# Altium footprint library PcbLib_jp.PcbLib: 255 footprints (part 5 of 16)
Each footprint in its own frame and in the unit in brackets; x right, y up, seen from the top. Pads: shape width x height; smd on the part's side, far side on the other; paste and mask are expansions set on the pad; w line width, h text height; cw(c..) or ccw(c..) is an arc to the next point about the centre after c.
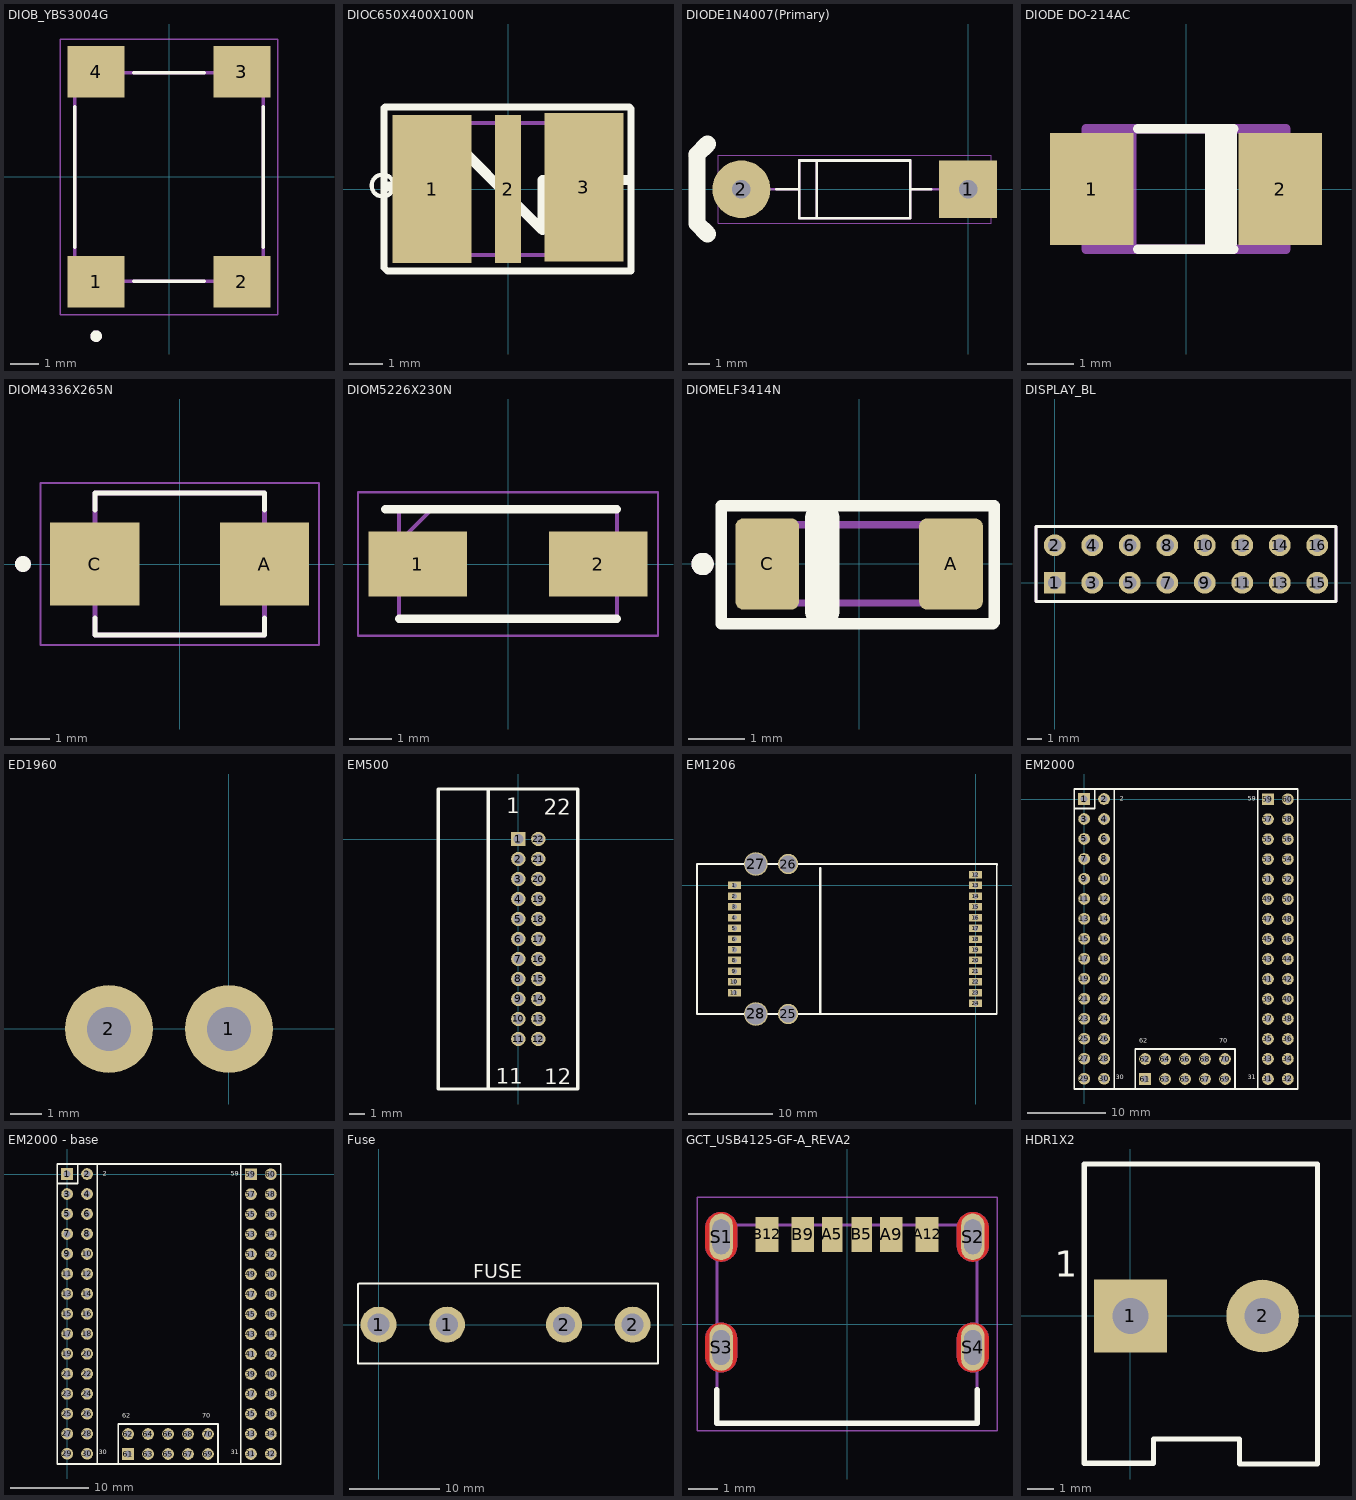
[diagram p4: the footprints below, top view; thin cyan lines are the x and y axes]

## DIOB_YBS3004G [mm]
pads (4):
  rect 2x1.8 smd: 1(-2.55,-3.675) 2(2.55,-3.675) 3(2.55,3.675) 4(-2.55,3.675)
Top Overlay:
  circle w0.2: c-2.55,-5.575 r0.1
  lines w0.127: -3.3,-2.455 -3.3,2.455 ; -1.23,-3.65 1.23,-3.65 ; -1.23,3.65 1.23,3.65 ; 3.3,-2.455 3.3,2.455
Mechanical 13:
  circle w0.2: c-2.55,-5.575 r0.1
  lines w0.127: -3.3,-3.65 3.3,-3.65 3.3,3.65 -3.3,3.65 -3.3,-3.65
Mechanical 15:
  lines w0.05: -3.8,-4.825 3.8,-4.825 3.8,4.825 -3.8,4.825 -3.8,-4.825
3D body "step_temp.STEP": height 1.5, standoff 0, extent -3.3,-4.125 3.3,4.125

## DIOC650X400X100N [mm]
pads (3):
  rect 2.4x4.5 smd paste-3 mask+0: 1(-2.3,0) 3(2.3,0.05)
  rect 0.8x4.5 smd paste-3 mask+0: 2(0,0)
Top Overlay:
  circle w0.127: c-3.803,0.105 r0.333
  lines w0.203: -3.759,-2.388 -3.759,2.464 -3.734,2.489 3.683,2.489 3.734,2.438 3.734,-2.489 -3.658,-2.489 -3.759,-2.388
  lines w0.305: -3.658,0.076 -2.362,0.076 -2.286,0.152 -2.286,2.083 1.041,-1.245 1.041,0.279 3.607,0.279
Top Paste:
  region: 2.925,-1.678 1.127,-1.678 1.127,1.675 2.925,1.675
  region: 0.375,-1.675 -0.375,-1.675 -0.375,1.675 0.375,1.675
  region: -1.125,-1.677 -2.929,-1.677 -2.929,1.675 -1.125,1.675
Top Solder:
  region: 0.4,-1.7 -0.4,-1.7 -0.4,1.7 0.4,1.7
  region: -1.1,-1.701 -2.952,-1.701 -2.952,1.7 -1.1,1.7
  region: 2.95,-1.701 1.101,-1.701 1.101,1.7 2.95,1.7
Mechanical 13:
  lines w0.127: -3.25,-2 3.25,-2 3.25,2 -3.25,2 -3.25,-2
Mechanical 15:
  lines w0.05: -3.75,-2.5 3.75,-2.5 3.75,2.5 -3.75,2.5 -3.75,-2.5
3D body "User Library-TBU_DF(2).STEP": height 2.01, standoff 0.95, extent -3.427,-2.896 3.173,2.704

## DIODE1N4007(Primary) [mm]
pads (2):
  rect 2.7x2.7 hole 0.86: 1(0,0)
  round 2.7 hole 0.86: 2(-10.6,0)
Top Layer:
  lines w0.8: -12.675,1.6 -12.675,1.626 -12.675,1.6
Top Overlay:
  lines w0.127: -8.958,0 -7.9,0 ; -1.719,0 -2.7,0 ; -7.9,0 -7.9,1.35 -7.075,1.35 ; -7.9,0 -7.9,-1.35 -7.075,-1.35 ; -7.075,-1.35 -2.7,-1.35 -2.7,0 ; -7.075,-1.35 -7.075,1.35 ; -7.075,1.35 -2.7,1.35 -2.7,0
  lines w0.8: -12.675,1.6 -12.675,-1.6 -12.192,-2.083 ; -12.675,1.626 -12.192,2.108
Mechanical 13:
  lines w0.127: -7.9,-1.35 -7.075,-1.35 ; -7.9,-1.35 -7.9,0 ; -7.9,-1.35 -7.075,-1.35 ; -7.9,-1.35 -7.9,0 ; -7.9,0 -7.9,1.35 ; -7.9,0 -9.2,0 -7.9,0 ; -7.9,0 -7.9,1.35 ; -7.9,1.35 -7.075,1.35 ; -7.9,1.35 -7.075,1.35 ; -7.075,-1.35 -7.075,1.35 ; -7.075,-1.35 -2.7,-1.35 ; -7.075,-1.35 -2.7,-1.35 ; -7.075,-1.35 -7.075,1.35 ; -7.075,1.35 -2.7,1.35 ; -7.075,1.35 -2.7,1.35 ; -2.7,-1.35 -2.7,0 ; -2.7,-1.35 -2.7,0 ; -2.7,0 -2.7,1.35 ; -2.7,0 -1.4,0 -2.7,0 ; -2.7,0 -2.7,1.35
Mechanical 16:
  lines w0.05: -11.675,-1.6 1.075,-1.6 1.075,1.6 -11.675,1.6 -11.675,-1.6
3D body: height 0.25, standoff 0, extent -0.601,3.302 -0.601,3.302
3D body "User Library-1N4007 x7mm.STEP": height 6.31, standoff 1.1, extent -9.073,-1.437 -1.273,1.183

## DIODE DO-214AC [mm]
pads (2):
  rect 1.8x2.4 smd: 1(-2.025,0) 2(2.025,0)
Top Overlay:
  region: 1.092,-1.2 0.417,-1.2 0.417,1.251 1.092,1.251
  lines w0.203: -1.035,-1.3 1.025,-1.3 ; -1.035,1.3 1.025,1.3
Mechanical 13:
  region: -1.075,-1.226 -1.751,-1.226 -1.751,1.225 -1.075,1.225
  region: 2.825,-1.102 2.178,-1.102 2.178,1.1 2.825,1.1
  region: -2.175,-1.1 -2.826,-1.1 -2.826,1.1 -2.175,1.1
  lines w0.203: -2.15,-1.3 -2.15,1.3 2.15,1.3 2.15,-1.3 -2.15,-1.3
3D body "User Library-DO-214AC SMA.STEP": height 2, standoff -0.4, extent -2.6,-1.326 2.6,1.274
3D body: height 0.25, standoff 0, extent 0.483,-0.025 0.483,-0.025
3D body: height 0.25, standoff 0, extent 0.813,0 0.813,0

## DIOM4336X265N [mm]
pads (2):
  rect 2.28x2.12 smd: A(2.165,0) C(-2.165,0)
Top Overlay:
  circle w0.2: c-4,0 r0.1
  lines w0.127: -2.163,-1.38 -2.163,-1.813 2.163,-1.813 2.163,-1.38 ; -2.163,1.38 -2.163,1.813 2.163,1.813 2.163,1.38
Mechanical 13:
  circle w0.2: c-4,0 r0.1
  lines w0.127: -2.163,-1.813 2.163,-1.813 2.163,1.813 -2.163,1.813 -2.163,-1.813
Mechanical 15:
  lines w0.05: -3.555,-2.063 3.555,-2.063 3.555,2.063 -3.555,2.063 -3.555,-2.063
3D body "SS23.STEP": height 2.65, standoff 0, extent -2.7,-1.842 2.64,1.783

## DIOM5226X230N [mm]
pads (2):
  rect 2.35x1.55 smd: 1(-2.15,0) 2(2.15,0)
Top Overlay:
  lines w0.2: -2.925,1.302 2.598,1.302 ; -2.598,-1.302 2.598,-1.302
Mechanical 13:
  lines w0.1: -2.598,0.528 -1.822,1.302 ; -2.598,-1.302 2.598,-1.302 2.598,1.302 -2.598,1.302 -2.598,-1.302
Mechanical 15:
  lines w0.05: -3.575,-1.71 3.575,-1.71 3.575,1.71 -3.575,1.71 -3.575,-1.71
3D body "B320A-13-F.stp": height 2.3, standoff 0, extent -2.598,-1.302 2.598,1.302

## DIOMELF3414N [mm]
pads (2):
  rrect25% 1.14x1.63 smd: A(1.64,0) C(-1.64,0)
Top Overlay:
  circle w0.2: c-2.795,0 r0.1
  lines w0.203: -2.464,-1.067 -2.464,1.041 2.413,1.041 2.413,-1.041 2.388,-1.067 -2.464,-1.067
  lines w0.61: -0.66,-0.838 -0.66,0.813
Mechanical 13:
  circle w0.2: c-2.795,0 r0.1
  lines w0.127: -1.7,-0.7 1.7,-0.7 1.7,0.7 -1.7,0.7 -1.7,-0.7
Mechanical 15:
  lines w0.05: -2.46,-1.065 2.46,-1.065 2.46,1.065 -2.46,1.065 -2.46,-1.065
3D body "FDLL4148.STEP": height 1.75, standoff 0.25, extent -1.725,-0.7 1.725,0.8

## DISPLAY_BL [mil]
pads (16):
  rect 58x58 / inner round 60 / far side rect 58x58 hole 37: 1(0,0)
  round 58 / inner round 60 / far side round 58 hole 37: 2(0,100) 3(100,0) 4(100,100) 5(200,0) 6(200,100) 7(300,0) 8(300,100) 9(400,0) 10(400,100) 11(500,0) 12(500,100) 13(600,0) 14(600,100) 15(700,0) 16(700,100)
Top Overlay:
  lines w8: -50,-50 750,-50 750,150 -50,150 -50,-50
Mechanical 1:
  lines w8: -50,-50 750,-50 750,150 -50,150 -50,-50
3D body "User Library-Header 2x8.STEP": height 372.44, standoff -125.59, extent -199.98,-125.19 900.01,237.02

## ED1960 [mil]
pads (2):
  round 110 / inner round 60 / far side round 110 hole 55 mask+10: 1(0,0) 2(-150,0)
Bottom Overlay:
  lines w7: -250,-75 100,-75 100,0 100,300 -250,300 -250,-75

## EM500 [mil]
pads (22):
  rect 36x35 / inner round 60 / far side rect 36x35 hole 25 mask+3: 1(0,0)
  oval 36x35 / inner round 60 / far side rect 36x35 hole 25 mask+3: 2(0,-50) 3(0,-100) 4(0,-150) 5(0,-200) 6(0,-250) 7(0,-300) 8(0,-350) 9(0,-400) 10(0,-450) 11(0,-500) 12(50,-500) 13(50,-450) 14(50,-400) 15(50,-350) 16(50,-300) 17(50,-250) 18(50,-200) 19(50,-150) 20(50,-100) 21(50,-50) 22(50,0)
Top Overlay:
  lines w8: -75,-625 -75,125 ; -200,-625 -200,-612.5 -200,125 148.42,125 148.42,-625 -200,-625
  text "22" at 64,61 h39.37
  text "1" at -30,64 h39.37
  text "11" at -57,-612 h39.37
  text "12" at 65,-613 h39.37
3D body "Tibbo Technology Inc-EM500.STEP": height 633.86, standoff -108.27, extent -161.97,-608.27 90,108.27
3D body: height 559.05, standoff 0, extent -200,125 -200,125

## EM1206 [mil]
pads (28):
  rect 60x35 hole 25: 1(-1125,0) 2(-1125,-50) 3(-1125,-100) 4(-1125,-150) 5(-1125,-200) 6(-1125,-250) 7(-1125,-300) 8(-1125,-350) 9(-1125,-400) 10(-1125,-450) 11(-1125,-500) 12(0,50) 13(0,0) 14(0,-50) 15(0,-100) 16(0,-150) 17(0,-200) 18(0,-250) 19(0,-300) 20(0,-350) 21(0,-400) 22(0,-450) 23(0,-500) 24(0,-550)
  round 94.47 hole 78.73: 25(-875,-600) 26(-875,100)
  round 110.23 hole 100: 27(-1025,100) 28(-1025,-600)
Top Overlay:
  lines w8: -1300,-600 75,-600 98.42,-600 98.42,86.53 100,100 -1300,100 -1300,-600
  lines w10: -725,-600 -725,80
  text ".Comment" at -920.47,-388.6 h56.25
  text ".Pattern" at -914.4,-216.33 h56.25
  text ".Designator" at -920.47,-303.63 h56.25
Mechanical 1:
  text ".Designator" at -906.53,-464.9 h56.25
3D body "Tibbo Technology Inc-EM1206+RJ203.STEP": height 869.68, standoff -23.84, extent -1307.58,-645.67 47.74,141.73

## EM2000 [mm] "TIBBO"
pads (70):
  rect 1.5x1.5 hole 0.9: 1(0,0) 59(23.368,-0.025) 61(7.753,-35.595)
  round 1.5 hole 0.9: 2(2.54,0) 3(0,-2.54) 4(2.54,-2.54) 5(0,-5.08) 6(2.54,-5.08) 7(0,-7.62) 8(2.54,-7.62) 9(0,-10.16) 10(2.54,-10.16) 11(0,-12.7) 12(2.54,-12.7) 13(0,-15.24) 14(2.54,-15.24) 15(0,-17.78) 16(2.54,-17.78) 17(0,-20.32) 18(2.54,-20.32) 19(0,-22.86) 20(2.54,-22.86) 21(0,-25.4) 22(2.54,-25.4) 23(0,-27.94) 24(2.54,-27.94) 25(0,-30.48) 26(2.54,-30.48) 27(0,-33.02) 28(2.54,-33.02) 29(0,-35.56) 30(2.54,-35.56) 31(23.368,-35.585) 32(25.908,-35.585) 33(23.368,-33.045) 34(25.908,-33.045) 35(23.368,-30.505) 36(25.908,-30.505) 37(23.368,-27.965) 38(25.908,-27.965) 39(23.368,-25.425) 40(25.908,-25.425) 41(23.368,-22.885) 42(25.908,-22.885) 43(23.368,-20.345) 44(25.908,-20.345) 45(23.368,-17.805) 46(25.908,-17.805) 47(23.368,-15.265) 48(25.908,-15.265) 49(23.368,-12.725) 50(25.908,-12.725) 51(23.368,-10.185) 52(25.908,-10.185) 53(23.368,-7.645) 54(25.908,-7.645) 55(23.368,-5.105) 56(25.908,-5.105) 57(23.368,-2.565) 58(25.908,-2.565) 60(25.908,-0.025) 62(7.753,-33.055) 63(10.293,-35.595) 64(10.293,-33.055) 65(12.833,-35.595) 66(12.833,-33.055) 67(15.373,-35.595) 68(15.373,-33.055) 69(17.913,-35.595) 70(17.913,-33.055)
Top Overlay:
  lines w0.2: 3.81,1.27 -1.27,1.27 -1.27,-36.83 3.81,-36.83 3.81,1.274 ; 6.559,1.235 19.259,1.235 ; 6.483,-36.865 19.183,-36.865 19.183,-31.785 6.483,-31.785 6.483,-36.865 ; 22.098,-36.855 27.178,-36.855 27.178,1.274 22.098,1.274 22.098,-36.855
  lines w0.203: -1.249,-36.866 27.151,-36.866 ; -1.249,-1.205 1.367,-1.205 1.367,1.259 ; 3.81,1.274 22.098,1.274
  text "62" at 7.035,-31.166 h1
  text "70" at 17.205,-31.166 h1
  text "30" at 4.025,-35.846 h1
  text "2" at 4.514,-0.407 h1
  text "31" at 20.775,-35.846 h1
  text "59" at 20.775,-0.396 h1
3D body "Tibbo Technology Inc-EM1000.step": height 10.5, standoff -1.1, extent -0.94,-36.59 27,1.51

## EM2000 - base [mm] "TIBBO"
pads (70):
  rect 1.5x1.5 hole 0.9: 1(0,0) 59(23.368,-0.025) 61(7.753,-35.595)
  round 1.5 hole 0.9: 2(2.54,0) 3(0,-2.54) 4(2.54,-2.54) 5(0,-5.08) 6(2.54,-5.08) 7(0,-7.62) 8(2.54,-7.62) 9(0,-10.16) 10(2.54,-10.16) 11(0,-12.7) 12(2.54,-12.7) 13(0,-15.24) 14(2.54,-15.24) 15(0,-17.78) 16(2.54,-17.78) 17(0,-20.32) 18(2.54,-20.32) 19(0,-22.86) 20(2.54,-22.86) 21(0,-25.4) 22(2.54,-25.4) 23(0,-27.94) 24(2.54,-27.94) 25(0,-30.48) 26(2.54,-30.48) 27(0,-33.02) 28(2.54,-33.02) 29(0,-35.56) 30(2.54,-35.56) 31(23.368,-35.585) 32(25.908,-35.585) 33(23.368,-33.045) 34(25.908,-33.045) 35(23.368,-30.505) 36(25.908,-30.505) 37(23.368,-27.965) 38(25.908,-27.965) 39(23.368,-25.425) 40(25.908,-25.425) 41(23.368,-22.885) 42(25.908,-22.885) 43(23.368,-20.345) 44(25.908,-20.345) 45(23.368,-17.805) 46(25.908,-17.805) 47(23.368,-15.265) 48(25.908,-15.265) 49(23.368,-12.725) 50(25.908,-12.725) 51(23.368,-10.185) 52(25.908,-10.185) 53(23.368,-7.645) 54(25.908,-7.645) 55(23.368,-5.105) 56(25.908,-5.105) 57(23.368,-2.565) 58(25.908,-2.565) 60(25.908,-0.025) 62(7.753,-33.055) 63(10.293,-35.595) 64(10.293,-33.055) 65(12.833,-35.595) 66(12.833,-33.055) 67(15.373,-35.595) 68(15.373,-33.055) 69(17.913,-35.595) 70(17.913,-33.055)
Top Overlay:
  lines w0.2: 3.81,1.27 -1.27,1.27 -1.27,-36.83 3.81,-36.83 3.81,1.274 ; 6.559,1.235 19.259,1.235 ; 6.483,-36.865 6.483,-31.785 19.183,-31.785 19.183,-36.865 6.483,-36.865 ; 22.098,-36.855 22.098,1.274 27.178,1.274 27.178,-36.855 22.098,-36.855
  lines w0.203: -1.249,-36.866 27.151,-36.866 ; -1.249,-1.205 1.367,-1.205 1.367,1.259 ; 3.81,1.274 22.098,1.274
  text "59" at 20.775,-0.396 h1
  text "31" at 20.775,-35.846 h1
  text "2" at 4.514,-0.407 h1
  text "30" at 4.025,-35.846 h1
  text "70" at 17.205,-31.166 h1
  text "62" at 7.035,-31.166 h1

## Fuse [mm]
pads (4):
  round 4 hole 2.43: 1(0,0) 1(7.62,0) 2(20.62,0) 2(28.24,0)
Top Overlay:
  lines w0.254: -2.286,4.482 -2.286,-4.318 31.064,-4.318 31.064,4.445 ; -2.159,4.572 31.064,4.572
  text "FUSE" at 10.516,5.156 h1.52
3D body: height 1.31, standoff -1.31, extent 25.908,11.684 25.908,11.684
3D body "CircuitWorks-FUSE.STEP": height 13.84, standoff 0.99, extent -0.301,-2.749 30.579,3.156

## GCT_USB4125-GF-A_REVA2 [mm]
pads (10):
  rect 0.7x1.2 smd: A5(-0.5,3.08) B5(0.5,3.08)
  rect 0.76x1.2 smd: A9(1.52,3.08) B9(-1.52,3.08)
  rect 0.8x1.2 smd: A12(2.75,3.08) B12(-2.75,3.08)
  oval 0.8x1.6 hole 0.6 slot 1.2 at 90 deg mask+0: S1(-4.32,3) S2(4.32,3) S3(-4.32,-0.8) S4(4.32,-0.8)
Top Layer:
  region: -4.291,0.049 -4.263,0.047 -4.234,0.043 -4.206,0.038 -4.178,0.031 -4.15,0.023 -4.123,0.013 -4.096,0.002 -4.07,-0.01 -4.045,-0.024 -4.02,-0.039 -3.997,-0.055 -3.974,-0.073 -3.952,-0.091 -3.931,-0.111 -3.911,-0.132 -3.893,-0.154 -3.875,-0.177 -3.859,-0.2 -3.844,-0.225 -3.83,-0.25 -3.818,-0.276 -3.807,-0.303 -3.797,-0.33 -3.789,-0.358 -3.782,-0.386 -3.777,-0.414 -3.773,-0.443 -3.771,-0.471 -3.77,-0.5 -3.77,-1.1 -3.771,-1.129 -3.773,-1.157 -3.777,-1.186 -3.782,-1.214 -3.789,-1.242 -3.797,-1.27 -3.807,-1.297 -3.818,-1.324 -3.83,-1.35 -3.844,-1.375 -3.859,-1.4 -3.875,-1.423 -3.893,-1.446 -3.911,-1.468 -3.931,-1.489 -3.952,-1.509 -3.974,-1.527 -3.997,-1.545 -4.02,-1.561 -4.045,-1.576 -4.07,-1.59 -4.096,-1.602 -4.123,-1.613 -4.15,-1.623 -4.178,-1.631 -4.206,-1.638 -4.234,-1.643 -4.263,-1.647 -4.291,-1.649 -4.32,-1.65 -4.349,-1.649 -4.377,-1.647 -4.406,-1.643 -4.434,-1.638 -4.462,-1.631 -4.49,-1.623 -4.517,-1.613 -4.544,-1.602 -4.57,-1.59 -4.595,-1.576 -4.62,-1.561 -4.643,-1.545 -4.666,-1.527 -4.688,-1.509 -4.709,-1.489 -4.729,-1.468 -4.747,-1.446 -4.765,-1.423 -4.781,-1.4 -4.796,-1.375 -4.81,-1.35 -4.822,-1.324 -4.833,-1.297 -4.843,-1.27 -4.851,-1.242 -4.858,-1.214 -4.863,-1.186 -4.867,-1.157 -4.869,-1.129 -4.87,-1.1 -4.87,-0.5 -4.869,-0.471 -4.867,-0.443 -4.863,-0.414 -4.858,-0.386 -4.851,-0.358 -4.843,-0.33 -4.833,-0.303 -4.822,-0.276 -4.81,-0.25 -4.796,-0.225 -4.781,-0.2 -4.765,-0.177 -4.747,-0.154 -4.729,-0.132 -4.709,-0.111 -4.688,-0.091 -4.666,-0.073 -4.643,-0.055 -4.62,-0.039 -4.595,-0.024 -4.57,-0.01 -4.544,0.002 -4.517,0.013 -4.49,0.023 -4.462,0.031 -4.434,0.038 -4.406,0.043 -4.377,0.047 -4.349,0.049 -4.32,0.05
  region: 4.349,0.049 4.377,0.047 4.406,0.043 4.434,0.038 4.462,0.031 4.49,0.023 4.517,0.013 4.544,0.002 4.57,-0.01 4.595,-0.024 4.62,-0.039 4.643,-0.055 4.666,-0.073 4.688,-0.091 4.709,-0.111 4.729,-0.132 4.747,-0.154 4.765,-0.177 4.781,-0.2 4.796,-0.225 4.81,-0.25 4.822,-0.276 4.833,-0.303 4.843,-0.33 4.851,-0.358 4.858,-0.386 4.863,-0.414 4.867,-0.443 4.869,-0.471 4.87,-0.5 4.87,-1.1 4.869,-1.129 4.867,-1.157 4.863,-1.186 4.858,-1.214 4.851,-1.242 4.843,-1.27 4.833,-1.297 4.822,-1.324 4.81,-1.35 4.796,-1.375 4.781,-1.4 4.765,-1.423 4.747,-1.446 4.729,-1.468 4.709,-1.489 4.688,-1.509 4.666,-1.527 4.643,-1.545 4.62,-1.561 4.595,-1.576 4.57,-1.59 4.544,-1.602 4.517,-1.613 4.49,-1.623 4.462,-1.631 4.434,-1.638 4.406,-1.643 4.377,-1.647 4.349,-1.649 4.32,-1.65 4.291,-1.649 4.263,-1.647 4.234,-1.643 4.206,-1.638 4.178,-1.631 4.15,-1.623 4.123,-1.613 4.096,-1.602 4.07,-1.59 4.045,-1.576 4.02,-1.561 3.997,-1.545 3.974,-1.527 3.952,-1.509 3.931,-1.489 3.911,-1.468 3.893,-1.446 3.875,-1.423 3.859,-1.4 3.844,-1.375 3.83,-1.35 3.818,-1.324 3.807,-1.297 3.797,-1.27 3.789,-1.242 3.782,-1.214 3.777,-1.186 3.773,-1.157 3.771,-1.129 3.77,-1.1 3.77,-0.5 3.771,-0.471 3.773,-0.443 3.777,-0.414 3.782,-0.386 3.789,-0.358 3.797,-0.33 3.807,-0.303 3.818,-0.276 3.83,-0.25 3.844,-0.225 3.859,-0.2 3.875,-0.177 3.893,-0.154 3.911,-0.132 3.931,-0.111 3.952,-0.091 3.974,-0.073 3.997,-0.055 4.02,-0.039 4.045,-0.024 4.07,-0.01 4.096,0.002 4.123,0.013 4.15,0.023 4.178,0.031 4.206,0.038 4.234,0.043 4.263,0.047 4.291,0.049 4.32,0.05
  region: -4.291,3.849 -4.263,3.847 -4.234,3.843 -4.206,3.838 -4.178,3.831 -4.15,3.823 -4.123,3.813 -4.096,3.802 -4.07,3.79 -4.045,3.776 -4.02,3.761 -3.997,3.745 -3.974,3.727 -3.952,3.709 -3.931,3.689 -3.911,3.668 -3.893,3.646 -3.875,3.623 -3.859,3.6 -3.844,3.575 -3.83,3.55 -3.818,3.524 -3.807,3.497 -3.797,3.47 -3.789,3.442 -3.782,3.414 -3.777,3.386 -3.773,3.357 -3.771,3.329 -3.77,3.3 -3.77,2.7 -3.771,2.671 -3.773,2.643 -3.777,2.614 -3.782,2.586 -3.789,2.558 -3.797,2.53 -3.807,2.503 -3.818,2.476 -3.83,2.45 -3.844,2.425 -3.859,2.4 -3.875,2.377 -3.893,2.354 -3.911,2.332 -3.931,2.311 -3.952,2.291 -3.974,2.273 -3.997,2.255 -4.02,2.239 -4.045,2.224 -4.07,2.21 -4.096,2.198 -4.123,2.187 -4.15,2.177 -4.178,2.169 -4.206,2.162 -4.234,2.157 -4.263,2.153 -4.291,2.151 -4.32,2.15 -4.349,2.151 -4.377,2.153 -4.406,2.157 -4.434,2.162 -4.462,2.169 -4.49,2.177 -4.517,2.187 -4.544,2.198 -4.57,2.21 -4.595,2.224 -4.62,2.239 -4.643,2.255 -4.666,2.273 -4.688,2.291 -4.709,2.311 -4.729,2.332 -4.747,2.354 -4.765,2.377 -4.781,2.4 -4.796,2.425 -4.81,2.45 -4.822,2.476 -4.833,2.503 -4.843,2.53 -4.851,2.558 -4.858,2.586 -4.863,2.614 -4.867,2.643 -4.869,2.671 -4.87,2.7 -4.87,3.3 -4.869,3.329 -4.867,3.357 -4.863,3.386 -4.858,3.414 -4.851,3.442 -4.843,3.47 -4.833,3.497 -4.822,3.524 -4.81,3.55 -4.796,3.575 -4.781,3.6 -4.765,3.623 -4.747,3.646 -4.729,3.668 -4.709,3.689 -4.688,3.709 -4.666,3.727 -4.643,3.745 -4.62,3.761 -4.595,3.776 -4.57,3.79 -4.544,3.802 -4.517,3.813 -4.49,3.823 -4.462,3.831 -4.434,3.838 -4.406,3.843 -4.377,3.847 -4.349,3.849 -4.32,3.85
  region: 4.349,3.849 4.377,3.847 4.406,3.843 4.434,3.838 4.462,3.831 4.49,3.823 4.517,3.813 4.544,3.802 4.57,3.79 4.595,3.776 4.62,3.761 4.643,3.745 4.666,3.727 4.688,3.709 4.709,3.689 4.729,3.668 4.747,3.646 4.765,3.623 4.781,3.6 4.796,3.575 4.81,3.55 4.822,3.524 4.833,3.497 4.843,3.47 4.851,3.442 4.858,3.414 4.863,3.386 4.867,3.357 4.869,3.329 4.87,3.3 4.87,2.7 4.869,2.671 4.867,2.643 4.863,2.614 4.858,2.586 4.851,2.558 4.843,2.53 4.833,2.503 4.822,2.476 4.81,2.45 4.796,2.425 4.781,2.4 4.765,2.377 4.747,2.354 4.729,2.332 4.709,2.311 4.688,2.291 4.666,2.273 4.643,2.255 4.62,2.239 4.595,2.224 4.57,2.21 4.544,2.198 4.517,2.187 4.49,2.177 4.462,2.169 4.434,2.162 4.406,2.157 4.377,2.153 4.349,2.151 4.32,2.15 4.291,2.151 4.263,2.153 4.234,2.157 4.206,2.162 4.178,2.169 4.15,2.177 4.123,2.187 4.096,2.198 4.07,2.21 4.045,2.224 4.02,2.239 3.997,2.255 3.974,2.273 3.952,2.291 3.931,2.311 3.911,2.332 3.893,2.354 3.875,2.377 3.859,2.4 3.844,2.425 3.83,2.45 3.818,2.476 3.807,2.503 3.797,2.53 3.789,2.558 3.782,2.586 3.777,2.614 3.773,2.643 3.771,2.671 3.77,2.7 3.77,3.3 3.771,3.329 3.773,3.357 3.777,3.386 3.782,3.414 3.789,3.442 3.797,3.47 3.807,3.497 3.818,3.524 3.83,3.55 3.844,3.575 3.859,3.6 3.875,3.623 3.893,3.646 3.911,3.668 3.931,3.689 3.952,3.709 3.974,3.727 3.997,3.745 4.02,3.761 4.045,3.776 4.07,3.79 4.096,3.802 4.123,3.813 4.15,3.823 4.178,3.831 4.206,3.838 4.234,3.843 4.263,3.847 4.291,3.849 4.32,3.85
Bottom Layer:
  region: -4.291,0.049 -4.263,0.047 -4.234,0.043 -4.206,0.038 -4.178,0.031 -4.15,0.023 -4.123,0.013 -4.096,0.002 -4.07,-0.01 -4.045,-0.024 -4.02,-0.039 -3.997,-0.055 -3.974,-0.073 -3.952,-0.091 -3.931,-0.111 -3.911,-0.132 -3.893,-0.154 -3.875,-0.177 -3.859,-0.2 -3.844,-0.225 -3.83,-0.25 -3.818,-0.276 -3.807,-0.303 -3.797,-0.33 -3.789,-0.358 -3.782,-0.386 -3.777,-0.414 -3.773,-0.443 -3.771,-0.471 -3.77,-0.5 -3.77,-1.1 -3.771,-1.129 -3.773,-1.157 -3.777,-1.186 -3.782,-1.214 -3.789,-1.242 -3.797,-1.27 -3.807,-1.297 -3.818,-1.324 -3.83,-1.35 -3.844,-1.375 -3.859,-1.4 -3.875,-1.423 -3.893,-1.446 -3.911,-1.468 -3.931,-1.489 -3.952,-1.509 -3.974,-1.527 -3.997,-1.545 -4.02,-1.561 -4.045,-1.576 -4.07,-1.59 -4.096,-1.602 -4.123,-1.613 -4.15,-1.623 -4.178,-1.631 -4.206,-1.638 -4.234,-1.643 -4.263,-1.647 -4.291,-1.649 -4.32,-1.65 -4.349,-1.649 -4.377,-1.647 -4.406,-1.643 -4.434,-1.638 -4.462,-1.631 -4.49,-1.623 -4.517,-1.613 -4.544,-1.602 -4.57,-1.59 -4.595,-1.576 -4.62,-1.561 -4.643,-1.545 -4.666,-1.527 -4.688,-1.509 -4.709,-1.489 -4.729,-1.468 -4.747,-1.446 -4.765,-1.423 -4.781,-1.4 -4.796,-1.375 -4.81,-1.35 -4.822,-1.324 -4.833,-1.297 -4.843,-1.27 -4.851,-1.242 -4.858,-1.214 -4.863,-1.186 -4.867,-1.157 -4.869,-1.129 -4.87,-1.1 -4.87,-0.5 -4.869,-0.471 -4.867,-0.443 -4.863,-0.414 -4.858,-0.386 -4.851,-0.358 -4.843,-0.33 -4.833,-0.303 -4.822,-0.276 -4.81,-0.25 -4.796,-0.225 -4.781,-0.2 -4.765,-0.177 -4.747,-0.154 -4.729,-0.132 -4.709,-0.111 -4.688,-0.091 -4.666,-0.073 -4.643,-0.055 -4.62,-0.039 -4.595,-0.024 -4.57,-0.01 -4.544,0.002 -4.517,0.013 -4.49,0.023 -4.462,0.031 -4.434,0.038 -4.406,0.043 -4.377,0.047 -4.349,0.049 -4.32,0.05
  region: 4.349,0.049 4.377,0.047 4.406,0.043 4.434,0.038 4.462,0.031 4.49,0.023 4.517,0.013 4.544,0.002 4.57,-0.01 4.595,-0.024 4.62,-0.039 4.643,-0.055 4.666,-0.073 4.688,-0.091 4.709,-0.111 4.729,-0.132 4.747,-0.154 4.765,-0.177 4.781,-0.2 4.796,-0.225 4.81,-0.25 4.822,-0.276 4.833,-0.303 4.843,-0.33 4.851,-0.358 4.858,-0.386 4.863,-0.414 4.867,-0.443 4.869,-0.471 4.87,-0.5 4.87,-1.1 4.869,-1.129 4.867,-1.157 4.863,-1.186 4.858,-1.214 4.851,-1.242 4.843,-1.27 4.833,-1.297 4.822,-1.324 4.81,-1.35 4.796,-1.375 4.781,-1.4 4.765,-1.423 4.747,-1.446 4.729,-1.468 4.709,-1.489 4.688,-1.509 4.666,-1.527 4.643,-1.545 4.62,-1.561 4.595,-1.576 4.57,-1.59 4.544,-1.602 4.517,-1.613 4.49,-1.623 4.462,-1.631 4.434,-1.638 4.406,-1.643 4.377,-1.647 4.349,-1.649 4.32,-1.65 4.291,-1.649 4.263,-1.647 4.234,-1.643 4.206,-1.638 4.178,-1.631 4.15,-1.623 4.123,-1.613 4.096,-1.602 4.07,-1.59 4.045,-1.576 4.02,-1.561 3.997,-1.545 3.974,-1.527 3.952,-1.509 3.931,-1.489 3.911,-1.468 3.893,-1.446 3.875,-1.423 3.859,-1.4 3.844,-1.375 3.83,-1.35 3.818,-1.324 3.807,-1.297 3.797,-1.27 3.789,-1.242 3.782,-1.214 3.777,-1.186 3.773,-1.157 3.771,-1.129 3.77,-1.1 3.77,-0.5 3.771,-0.471 3.773,-0.443 3.777,-0.414 3.782,-0.386 3.789,-0.358 3.797,-0.33 3.807,-0.303 3.818,-0.276 3.83,-0.25 3.844,-0.225 3.859,-0.2 3.875,-0.177 3.893,-0.154 3.911,-0.132 3.931,-0.111 3.952,-0.091 3.974,-0.073 3.997,-0.055 4.02,-0.039 4.045,-0.024 4.07,-0.01 4.096,0.002 4.123,0.013 4.15,0.023 4.178,0.031 4.206,0.038 4.234,0.043 4.263,0.047 4.291,0.049 4.32,0.05
  region: -4.291,3.849 -4.263,3.847 -4.234,3.843 -4.206,3.838 -4.178,3.831 -4.15,3.823 -4.123,3.813 -4.096,3.802 -4.07,3.79 -4.045,3.776 -4.02,3.761 -3.997,3.745 -3.974,3.727 -3.952,3.709 -3.931,3.689 -3.911,3.668 -3.893,3.646 -3.875,3.623 -3.859,3.6 -3.844,3.575 -3.83,3.55 -3.818,3.524 -3.807,3.497 -3.797,3.47 -3.789,3.442 -3.782,3.414 -3.777,3.386 -3.773,3.357 -3.771,3.329 -3.77,3.3 -3.77,2.7 -3.771,2.671 -3.773,2.643 -3.777,2.614 -3.782,2.586 -3.789,2.558 -3.797,2.53 -3.807,2.503 -3.818,2.476 -3.83,2.45 -3.844,2.425 -3.859,2.4 -3.875,2.377 -3.893,2.354 -3.911,2.332 -3.931,2.311 -3.952,2.291 -3.974,2.273 -3.997,2.255 -4.02,2.239 -4.045,2.224 -4.07,2.21 -4.096,2.198 -4.123,2.187 -4.15,2.177 -4.178,2.169 -4.206,2.162 -4.234,2.157 -4.263,2.153 -4.291,2.151 -4.32,2.15 -4.349,2.151 -4.377,2.153 -4.406,2.157 -4.434,2.162 -4.462,2.169 -4.49,2.177 -4.517,2.187 -4.544,2.198 -4.57,2.21 -4.595,2.224 -4.62,2.239 -4.643,2.255 -4.666,2.273 -4.688,2.291 -4.709,2.311 -4.729,2.332 -4.747,2.354 -4.765,2.377 -4.781,2.4 -4.796,2.425 -4.81,2.45 -4.822,2.476 -4.833,2.503 -4.843,2.53 -4.851,2.558 -4.858,2.586 -4.863,2.614 -4.867,2.643 -4.869,2.671 -4.87,2.7 -4.87,3.3 -4.869,3.329 -4.867,3.357 -4.863,3.386 -4.858,3.414 -4.851,3.442 -4.843,3.47 -4.833,3.497 -4.822,3.524 -4.81,3.55 -4.796,3.575 -4.781,3.6 -4.765,3.623 -4.747,3.646 -4.729,3.668 -4.709,3.689 -4.688,3.709 -4.666,3.727 -4.643,3.745 -4.62,3.761 -4.595,3.776 -4.57,3.79 -4.544,3.802 -4.517,3.813 -4.49,3.823 -4.462,3.831 -4.434,3.838 -4.406,3.843 -4.377,3.847 -4.349,3.849 -4.32,3.85
  region: 4.349,3.849 4.377,3.847 4.406,3.843 4.434,3.838 4.462,3.831 4.49,3.823 4.517,3.813 4.544,3.802 4.57,3.79 4.595,3.776 4.62,3.761 4.643,3.745 4.666,3.727 4.688,3.709 4.709,3.689 4.729,3.668 4.747,3.646 4.765,3.623 4.781,3.6 4.796,3.575 4.81,3.55 4.822,3.524 4.833,3.497 4.843,3.47 4.851,3.442 4.858,3.414 4.863,3.386 4.867,3.357 4.869,3.329 4.87,3.3 4.87,2.7 4.869,2.671 4.867,2.643 4.863,2.614 4.858,2.586 4.851,2.558 4.843,2.53 4.833,2.503 4.822,2.476 4.81,2.45 4.796,2.425 4.781,2.4 4.765,2.377 4.747,2.354 4.729,2.332 4.709,2.311 4.688,2.291 4.666,2.273 4.643,2.255 4.62,2.239 4.595,2.224 4.57,2.21 4.544,2.198 4.517,2.187 4.49,2.177 4.462,2.169 4.434,2.162 4.406,2.157 4.377,2.153 4.349,2.151 4.32,2.15 4.291,2.151 4.263,2.153 4.234,2.157 4.206,2.162 4.178,2.169 4.15,2.177 4.123,2.187 4.096,2.198 4.07,2.21 4.045,2.224 4.02,2.239 3.997,2.255 3.974,2.273 3.952,2.291 3.931,2.311 3.911,2.332 3.893,2.354 3.875,2.377 3.859,2.4 3.844,2.425 3.83,2.45 3.818,2.476 3.807,2.503 3.797,2.53 3.789,2.558 3.782,2.586 3.777,2.614 3.773,2.643 3.771,2.671 3.77,2.7 3.77,3.3 3.771,3.329 3.773,3.357 3.777,3.386 3.782,3.414 3.789,3.442 3.797,3.47 3.807,3.497 3.818,3.524 3.83,3.55 3.844,3.575 3.859,3.6 3.875,3.623 3.893,3.646 3.911,3.668 3.931,3.689 3.952,3.709 3.974,3.727 3.997,3.745 4.02,3.761 4.045,3.776 4.07,3.79 4.096,3.802 4.123,3.813 4.15,3.823 4.178,3.831 4.206,3.838 4.234,3.843 4.263,3.847 4.291,3.849 4.32,3.85
Top Overlay:
  lines w0.2: -4.47,-2.25 -4.47,-3.4 4.47,-3.4 4.47,-2.25
Top Solder:
  drawing of 4 lines, arcs and shapes, not listed
Bottom Solder:
  drawing of 4 lines, arcs and shapes, not listed
Mechanical 13:
  lines w0.1: -4.47,-3.4 4.47,-3.4 4.47,3.4 -4.47,3.4 -4.47,-3.4
Mechanical 15:
  lines w0.05: -5.15,-3.65 5.15,-3.65 5.15,4.35 -5.15,4.35 -5.15,-3.65
3D body "USB4125-GF-A.step": height 3.26, standoff -1.25, extent -4.38,-3.25 4.56,3.65

## HDR1X2 [mil] "Connector; Header; 2 Position"
pads (2):
  rect 110x110 hole 55: 1(0,0)
  round 110 hole 55: 2(200,0)
Top Overlay:
  lines w7.87: -70,-223 35,-223 35,-186.1 165,-186.1 165,-224 283,-224 283,230 -70,230 -70,-223
  text "1" at -115,59 h39.37
3D body "010321021.stp": height 584.65, standoff -102.36, extent -73.74,-219.92 283.74,228.9